# Altium schematic symbol library MCU_Microchip_ATmega.SchLib: 440 symbols (part 6 of 7) (continued)
## ATxmega64B1-A (continued)

## ATxmega64B1-C
designator *  value ATxmega64B1-C  Reference: U
ki_keywords: AVR 8/16bit Microcontroller XMegaAVR; ki_description: 32MHz, 64kB Flash, 4kB Boot, 4kB SRAM, 2kB EEPROM, JTAG, USB, LCD, VFBGA-100; ki_fp_filters: VFBGA*7.0x7.0mm*Layout10x10*P0.65mm*; Footprint: Package_BGA:VFBGA-100_7.0x7.0mm_Layout10x10_P0.65mm; Datasheet: http://ww1.microchip.com/downloads/en/DeviceDoc/Atmel-8330-8-and-16-bit-AVR-Microcontroller-XMEGA-B-ATxmega64B1-ATxmega128B1_Datasheet.pdf
pins: A1 PC0, A2 VCC, A3 PB6, A4 PB2, A5 AVCC, A6 PA5, A7 PA1, A8 PR1/XTAL1, A9 COM2, A10 CAPH, B1 PC3, B2 GND, B3 PB7, B4 PB4, B5 AGND, B6 PA4, B7 PA0/AREF, B8 PR0/XTAL2, B9 COM1, B10 CAPL, C1 PC5, C2 PC4, C3 PC1, C4 PB5, C5 PA7, C6 PA3, C7 COM3, C8 COM0, C9 BIAS2, C10 BIAS1, D1 VCC hidden, D2 GND hidden, D3 PD0, D4 PC2, D5 PB0, D6 PA6, D7 SEG0, D8 VLCD, D9 GND hidden, D10 VCC hidden, E1 PD2, E2 ~{{RESET}/PDI_CLK}, E3 PD1, E4 PC6, E5 PB1, E6 PA2, E7 SEG1, E8 SEG4, E9 SEG3, E10 SEG2, F1 VCC hidden, F2 GND hidden, F3 PDI_DATA, F4 PC7, F5 PB3, F6 PM2/SEG29, F7 SEG10, F8 SEG7, F9 SEG6, F10 SEG5, G1 PE2, G2 PE1, G3 PE3, G4 PE0, G5 PE4, G6 SEG23, G7 SEG15, G8 SEG13, G9 SEG9, G10 SEG8, H1 PE5, H2 PE6, H3 PG1/SEG38, H4 PG4/SEG35, H5 PG7/SEG32, H6 PM5/SEG26, H7 SEG21, H8 SEG18, H9 SEG12, H10 SEG11, J1 PE7, J2 PG0/SEG39, J3 PG3/SEG36, J4 PG6/SEG33, J5 PM1/SEG30, J6 PM4/SEG27, J7 PM7/SEG24, J8 SEG20, J9 SEG16, J10 SEG14, K1 GND hidden, K2 VCC hidden, K3 PG2/SEG37, K4 PG5/SEG34, K5 PM0/SEG31, K6 PM3/SEG28, K7 PM6/SEG25, K8 SEG22, K9 SEG19, K10 SEG17

## ATxmega64B3-A
designator *  value ATxmega64B3-A  Reference: U
ki_keywords: AVR 8/16bit Microcontroller XMegaAVR; ki_description: 32MHz, 64kB Flash, 4kB Boot, 4kB SRAM, 2kB EEPROM, JTAG, USB, LCD, TQFP-64; ki_fp_filters: TQFP*14x14mm*P0.8mm*; Footprint: Package_QFP:TQFP-64_14x14mm_P0.8mm; Datasheet: http://ww1.microchip.com/downloads/en/DeviceDoc/Atmel-8074-8-and-16-bit-AVR-Microcontroller-XMEGA-B-ATxmega64B3-ATxmega128B3_Datasheet.pdf
pins: 1 PC0, 2 PC1, 3 PC2, 4 PC3, 5 PC4, 6 PC5, 7 PC6, 8 PC7, 9 GND, 10 VCC, 11 PD0, 12 PD1, 13 ~{{RESET}/PDI_CLK}, 14 PDI_DATA, 15 GND hidden, 16 VCC hidden, 17 PG0/SEG24, 18 PG1/SEG23, 19 PG2/SEG22, 20 PG3/SEG21, 21 PG4/SEG20, 22 PG5/SEG19, 23 PG6/SEG18, 24 PG7/SEG17, 25 PM0/SEG16, 26 PM1/SEG15, 27 PM2/SEG14, 28 PM3/SEG13, 29 PM4/SEG12, 30 PM5/SEG11, 31 PM6/SEG10, 32 PM7/SEG9, 33 SEG8, 34 SEG7, 35 SEG6, 36 SEG5, 37 SEG4, 38 SEG3, 39 SEG2, 40 SEG1, 41 SEG0, 42 GND hidden, 43 VCC hidden, 44 BIAS1, 45 BIAS2, 46 VLCD, 47 CAPL, 48 CAPH, 49 COM0, 50 COM1, 51 COM2, 52 COM3, 53 PR0/XTAL2, 54 PR1/XTAL1, 55 AGND, 56 AVCC, 57 PB0/AREF, 58 PB1, 59 PB2, 60 PB3, 61 PB4, 62 PB5, 63 PB6, 64 PB7

## ATxmega64B3-M
designator *  value ATxmega64B3-M  Reference: U
ki_keywords: AVR 8/16bit Microcontroller XMegaAVR; ki_description: 32MHz, 64kB Flash, 4kB Boot, 4kB SRAM, 2kB EEPROM, JTAG, USB, LCD, QFN-64; ki_fp_filters: QFN*1EP*9x9mm*P0.5mm*; Footprint: Package_DFN_QFN:QFN-64-1EP_9x9mm_P0.5mm_EP7.65x7.65mm; Datasheet: http://ww1.microchip.com/downloads/en/DeviceDoc/Atmel-8074-8-and-16-bit-AVR-Microcontroller-XMEGA-B-ATxmega64B3-ATxmega128B3_Datasheet.pdf
pins: 1 PC0, 2 PC1, 3 PC2, 4 PC3, 5 PC4, 6 PC5, 7 PC6, 8 PC7, 9 GND, 10 VCC, 11 PD0, 12 PD1, 13 ~{{RESET}/PDI_CLK}, 14 PDI_DATA, 15 GND hidden, 16 VCC hidden, 17 PG0/SEG24, 18 PG1/SEG23, 19 PG2/SEG22, 20 PG3/SEG21, 21 PG4/SEG20, 22 PG5/SEG19, 23 PG6/SEG18, 24 PG7/SEG17, 25 PM0/SEG16, 26 PM1/SEG15, 27 PM2/SEG14, 28 PM3/SEG13, 29 PM4/SEG12, 30 PM5/SEG11, 31 PM6/SEG10, 32 PM7/SEG9, 33 SEG8, 34 SEG7, 35 SEG6, 36 SEG5, 37 SEG4, 38 SEG3, 39 SEG2, 40 SEG1, 41 SEG0, 42 GND hidden, 43 VCC hidden, 44 BIAS1, 45 BIAS2, 46 VLCD, 47 CAPL, 48 CAPH, 49 COM0, 50 COM1, 51 COM2, 52 COM3, 53 PR0/XTAL2, 54 PR1/XTAL1, 55 AGND, 56 AVCC, 57 PB0/AREF, 58 PB1, 59 PB2, 60 PB3, 61 PB4, 62 PB5, 63 PB6, 64 PB7, 65 GND hidden

## ATxmega64C3-A
designator *  value ATxmega64C3-A  Reference: U
ki_keywords: AVR 8/16bit Microcontroller XMegaAVR; ki_description: 32MHz, 64kB Flash, 4kB Boot, 4kB SRAM, 2kB EEPROM, JTAG, USB, TQFP-64; ki_fp_filters: TQFP*14x14mm*P0.8mm*; Footprint: Package_QFP:TQFP-64_14x14mm_P0.8mm; Datasheet: http://ww1.microchip.com/downloads/en/DeviceDoc/Atmel-8492-8-and-16-bit-AVR-microcontroller-ATxmega32C3_64C3_128C3_192C3_256C3_datasheet.pdf
pins: 1 PA3, 2 PA4, 3 PA5, 4 PA6, 5 PA7, 6 AREFB/PB0, 7 PB1, 8 PB2, 9 PB3, 10 PB4, 11 PB5, 12 PB6, 13 PB7, 14 GND, 15 VCC, 16 PC0, 17 PC1, 18 PC2, 19 PC3, 20 PC4, 21 PC5, 22 PC6, 23 PC7, 24 GND hidden, 25 VCC hidden, 26 PD0, 27 PD1, 28 PD2, 29 PD3, 30 PD4, 31 PD5, 32 PD6, 33 PD7, 34 GND hidden, 35 VCC hidden, 36 PE0, 37 PE1, 38 PE2, 39 PE3, 40 PE4, 41 PE5, 42 PE6, 43 PE7, 44 GND hidden, 45 VCC hidden, 46 PF0, 47 PF1, 48 PF2, 49 PF3, 50 PF4, 51 PF5, 52 GND hidden, 53 VCC hidden, 54 PF6, 55 PF7, 56 PDI_DATA, 57 ~{{RESET}/PDI_CLK}, 58 PR0/XTAL2, 59 PR1/XTAL1, 60 GND hidden, 61 AVCC, 62 AREFA/PA0, 63 PA1, 64 PA2

## ATxmega64C3-M
designator *  value ATxmega64C3-M  Reference: U
ki_keywords: AVR 8/16bit Microcontroller XMegaAVR; ki_description: 32MHz, 64kB Flash, 4kB Boot, 4kB SRAM, 2kB EEPROM, JTAG, USB, QFN-64; ki_fp_filters: QFN*1EP*9x9mm*P0.5mm*; Footprint: Package_DFN_QFN:QFN-64-1EP_9x9mm_P0.5mm_EP7.65x7.65mm; Datasheet: http://ww1.microchip.com/downloads/en/DeviceDoc/Atmel-8492-8-and-16-bit-AVR-microcontroller-ATxmega32C3_64C3_128C3_192C3_256C3_datasheet.pdf
pins: 1 PA3, 2 PA4, 3 PA5, 4 PA6, 5 PA7, 6 AREFB/PB0, 7 PB1, 8 PB2, 9 PB3, 10 PB4, 11 PB5, 12 PB6, 13 PB7, 14 GND, 15 VCC, 16 PC0, 17 PC1, 18 PC2, 19 PC3, 20 PC4, 21 PC5, 22 PC6, 23 PC7, 24 GND hidden, 25 VCC hidden, 26 PD0, 27 PD1, 28 PD2, 29 PD3, 30 PD4, 31 PD5, 32 PD6, 33 PD7, 34 GND hidden, 35 VCC hidden, 36 PE0, 37 PE1, 38 PE2, 39 PE3, 40 PE4, 41 PE5, 42 PE6, 43 PE7, 44 GND hidden, 45 VCC hidden, 46 PF0, 47 PF1, 48 PF2, 49 PF3, 50 PF4, 51 PF5, 52 GND hidden, 53 VCC hidden, 54 PF6, 55 PF7, 56 PDI_DATA, 57 ~{{RESET}/PDI_CLK}, 58 PR0/XTAL2, 59 PR1/XTAL1, 60 GND hidden, 61 AVCC, 62 AREFA/PA0, 63 PA1, 64 PA2, 65 GND hidden

## ATxmega64D3-A
designator *  value ATxmega64D3-A  Reference: U
ki_keywords: AVR 8/16bit Microcontroller XMegaAVR; ki_description: 32MHz, 64kB Flash, 4kB Boot, 4kB SRAM, 2kB EEPROM, JTAG, TQFP-64; ki_fp_filters: TQFP*14x14mm*P0.8mm*; Footprint: Package_QFP:TQFP-64_14x14mm_P0.8mm; Datasheet: http://ww1.microchip.com/downloads/en/DeviceDoc/Atmel-8134-8-16-bit-Atmel-XMEGA-D3-Microcontroller_Datasheet.pdf
pins: 1 PA3, 2 PA4, 3 PA5, 4 PA6, 5 PA7, 6 AREFB/PB0, 7 PB1, 8 PB2, 9 PB3, 10 PB4, 11 PB5, 12 PB6, 13 PB7, 14 GND, 15 VCC, 16 PC0, 17 PC1, 18 PC2, 19 PC3, 20 PC4, 21 PC5, 22 PC6, 23 PC7, 24 GND hidden, 25 VCC hidden, 26 PD0, 27 PD1, 28 PD2, 29 PD3, 30 PD4, 31 PD5, 32 PD6, 33 PD7, 34 GND hidden, 35 VCC hidden, 36 PE0, 37 PE1, 38 PE2, 39 PE3, 40 PE4, 41 PE5, 42 PE6, 43 PE7, 44 GND hidden, 45 VCC hidden, 46 PF0, 47 PF1, 48 PF2, 49 PF3, 50 PF4, 51 PF5, 52 GND hidden, 53 VCC hidden, 54 PF6, 55 PF7, 56 PDI_DATA, 57 ~{{RESET}/PDI_CLK}, 58 PR0/XTAL2, 59 PR1/XTAL1, 60 GND hidden, 61 AVCC, 62 AREFA/PA0, 63 PA1, 64 PA2

## ATxmega64D3-M
designator *  value ATxmega64D3-M  Reference: U
ki_keywords: AVR 8/16bit Microcontroller XMegaAVR; ki_description: 32MHz, 64kB Flash, 4kB Boot, 4kB SRAM, 2kB EEPROM, JTAG, QFN-64; ki_fp_filters: QFN*1EP*9x9mm*P0.5mm*; Footprint: Package_DFN_QFN:QFN-64-1EP_9x9mm_P0.5mm_EP7.65x7.65mm; Datasheet: http://ww1.microchip.com/downloads/en/DeviceDoc/Atmel-8134-8-16-bit-Atmel-XMEGA-D3-Microcontroller_Datasheet.pdf
pins: 1 PA3, 2 PA4, 3 PA5, 4 PA6, 5 PA7, 6 AREFB/PB0, 7 PB1, 8 PB2, 9 PB3, 10 PB4, 11 PB5, 12 PB6, 13 PB7, 14 GND, 15 VCC, 16 PC0, 17 PC1, 18 PC2, 19 PC3, 20 PC4, 21 PC5, 22 PC6, 23 PC7, 24 GND hidden, 25 VCC hidden, 26 PD0, 27 PD1, 28 PD2, 29 PD3, 30 PD4, 31 PD5, 32 PD6, 33 PD7, 34 GND hidden, 35 VCC hidden, 36 PE0, 37 PE1, 38 PE2, 39 PE3, 40 PE4, 41 PE5, 42 PE6, 43 PE7, 44 GND hidden, 45 VCC hidden, 46 PF0, 47 PF1, 48 PF2, 49 PF3, 50 PF4, 51 PF5, 52 GND hidden, 53 VCC hidden, 54 PF6, 55 PF7, 56 PDI_DATA, 57 ~{{RESET}/PDI_CLK}, 58 PR0/XTAL2, 59 PR1/XTAL1, 60 GND hidden, 61 AVCC, 62 AREFA/PA0, 63 PA1, 64 PA2, 65 GND hidden

## ATxmega64D4-A
designator *  value ATxmega64D4-A  Reference: U
ki_keywords: AVR 8/16bit Microcontroller XMegaAVR; ki_description: 32MHz, 64kB Flash, 4kB Boot, 4kB SRAM, 2kB EEPROM, JTAG, TQFP-44; ki_fp_filters: TQFP*10x10mm*P0.8mm*; Footprint: Package_QFP:TQFP-44_10x10mm_P0.8mm; Datasheet: http://ww1.microchip.com/downloads/en/DeviceDoc/Atmel-8135-8-and-16-bit-AVR-microcontroller-ATxmega16D4-32D4-64D4-128D4_datasheet.pdf
pins: 1 PA5, 2 PA6, 3 PA7, 4 AREF/PB0, 5 PB1, 6 PB2, 7 PB3, 8 GND, 9 VCC, 10 PC0, 11 PC1, 12 PC2, 13 PC3, 14 PC4, 15 PC5, 16 PC6, 17 PC7, 18 GND hidden, 19 VCC hidden, 20 PD0, 21 PD1, 22 PD2, 23 PD3, 24 PD4, 25 PD5, 26 PD6, 27 PD7, 28 PE0, 29 PE1, 30 GND hidden, 31 VCC hidden, 32 PE2, 33 PE3, 34 PDI_DATA, 35 ~{{RESET}/PDI_CLK}, 36 PR0/XTAL2, 37 PR1/XTAL1, 38 GND hidden, 39 AVCC, 40 AREF/PA0, 41 PA1, 42 PA2, 43 PA3, 44 PA4

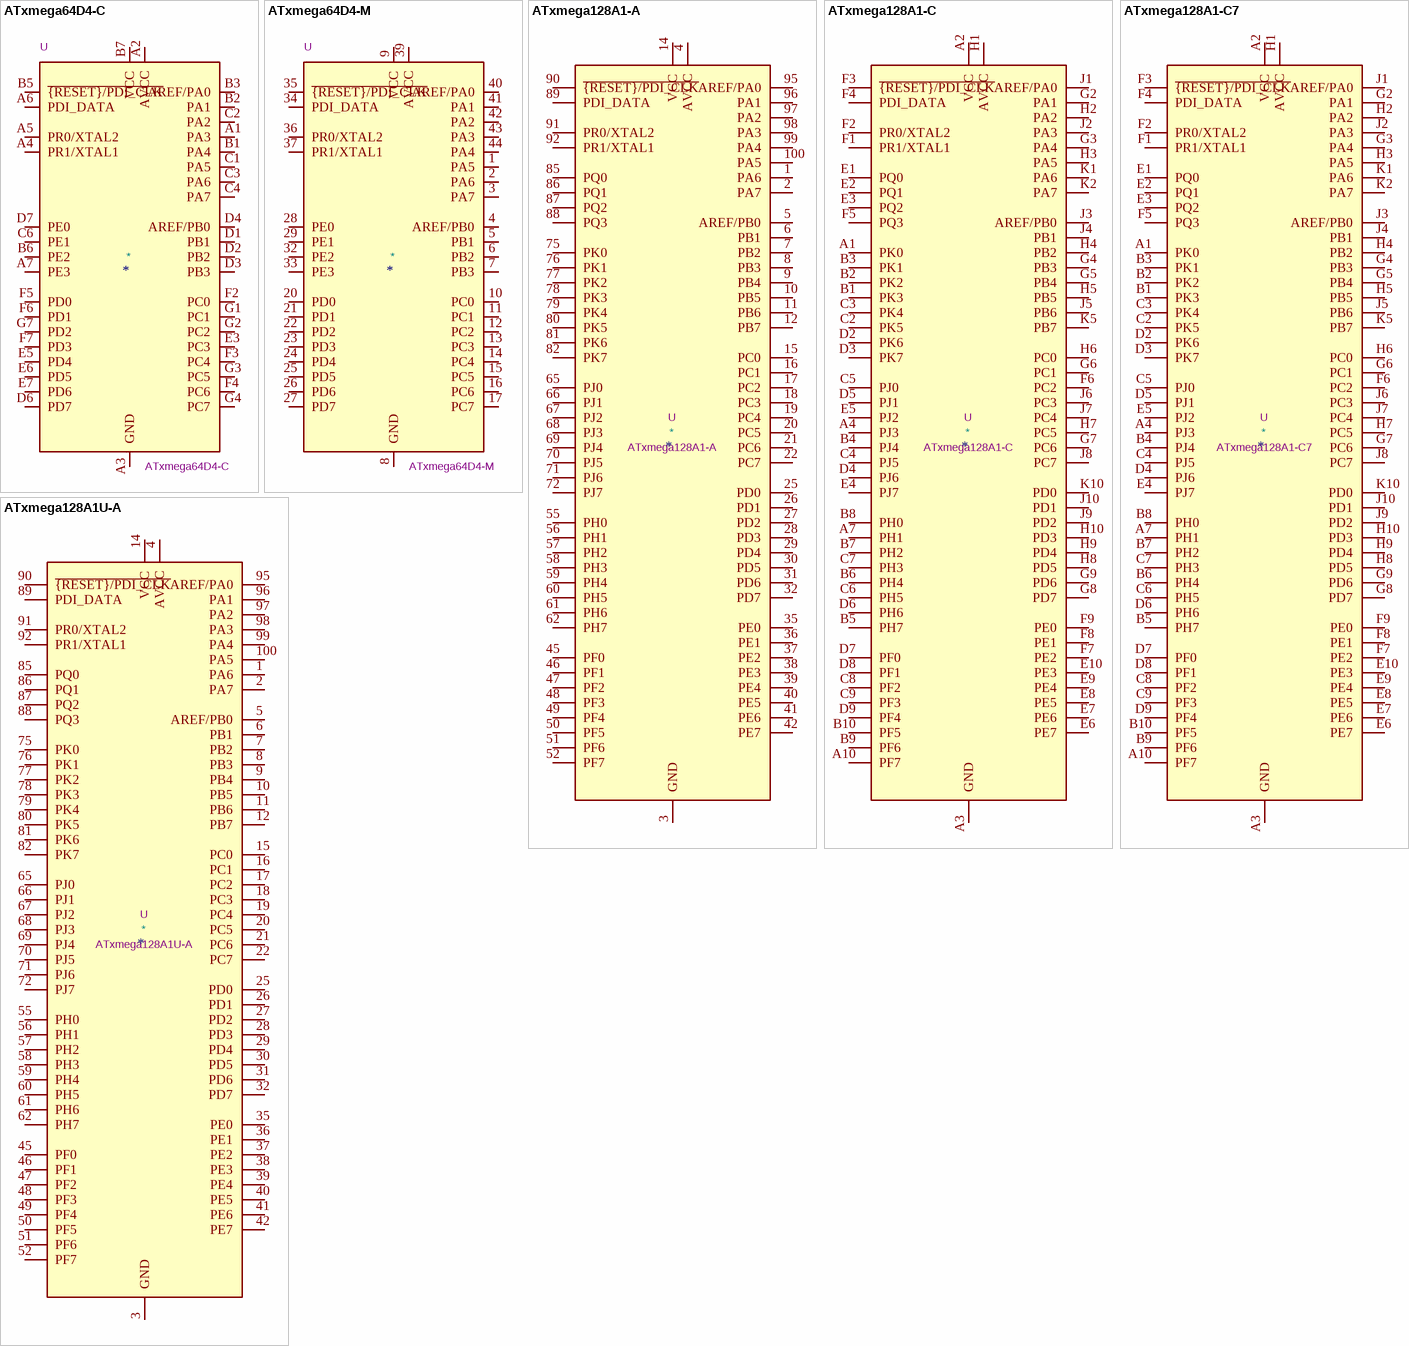
[diagram p35: symbols ATxmega64D4-C to ATxmega128A1U-A]

## ATxmega64D4-C
designator *  value ATxmega64D4-C  Reference: U
ki_keywords: AVR 8/16bit Microcontroller XMegaAVR; ki_description: 32MHz, 64kB Flash, 4kB Boot, 4kB SRAM, 2kB EEPROM, JTAG, VFBGA-49; ki_fp_filters: VFBGA*5.0x5.0mm*Layout7x7*P0.65mm*; Footprint: Package_BGA:VFBGA-49_5.0x5.0mm_Layout7x7_P0.65mm; Datasheet: http://ww1.microchip.com/downloads/en/DeviceDoc/Atmel-8135-8-and-16-bit-AVR-microcontroller-ATxmega16D4-32D4-64D4-128D4_datasheet.pdf
pins: A1 PA3, A2 AVCC, A3 GND, A4 PR1/XTAL1, A5 PR0/XTAL2, A6 PDI_DATA, A7 PE3, B1 PA4, B2 PA1, B3 AREF/PA0, B4 GND hidden, B5 ~{{RESET}/PDI_CLK}, B6 PE2, B7 VCC, C1 PA5, C2 PA2, C3 PA6, C4 PA7, C5 GND hidden, C6 PE1, C7 GND hidden, D1 PB1, D2 PB2, D3 PB3, D4 AREF/PB0, D5 GND hidden, D6 PD7, D7 PE0, E1 GND hidden, E2 GND hidden, E3 PC3, E4 GND hidden, E5 PD4, E6 PD5, E7 PD6, F1 VCC hidden, F2 PC0, F3 PC4, F4 PC6, F5 PD0, F6 PD1, F7 PD3, G1 PC1, G2 PC2, G3 PC5, G4 PC7, G5 GND hidden, G6 VCC hidden, G7 PD2

## ATxmega64D4-M
designator *  value ATxmega64D4-M  Reference: U
ki_keywords: AVR 8/16bit Microcontroller XMegaAVR; ki_description: 32MHz, 64kB Flash, 4kB Boot, 4kB SRAM, 2kB EEPROM, JTAG, QFN-44; ki_fp_filters: QFN*1EP*7x7mm*P0.5mm*; Footprint: Package_DFN_QFN:QFN-44-1EP_7x7mm_P0.5mm_EP5.2x5.2mm; Datasheet: http://ww1.microchip.com/downloads/en/DeviceDoc/Atmel-8135-8-and-16-bit-AVR-microcontroller-ATxmega16D4-32D4-64D4-128D4_datasheet.pdf
pins: 1 PA5, 2 PA6, 3 PA7, 4 AREF/PB0, 5 PB1, 6 PB2, 7 PB3, 8 GND, 9 VCC, 10 PC0, 11 PC1, 12 PC2, 13 PC3, 14 PC4, 15 PC5, 16 PC6, 17 PC7, 18 GND hidden, 19 VCC hidden, 20 PD0, 21 PD1, 22 PD2, 23 PD3, 24 PD4, 25 PD5, 26 PD6, 27 PD7, 28 PE0, 29 PE1, 30 GND hidden, 31 VCC hidden, 32 PE2, 33 PE3, 34 PDI_DATA, 35 ~{{RESET}/PDI_CLK}, 36 PR0/XTAL2, 37 PR1/XTAL1, 38 GND hidden, 39 AVCC, 40 AREF/PA0, 41 PA1, 42 PA2, 43 PA3, 44 PA4, 45 GND hidden

## ATxmega128A1-A
designator *  value ATxmega128A1-A  Reference: U
ki_keywords: AVR 8/16bit Microcontroller XMegaAVR; ki_description: 32MHz, 128kB Flash, 8kB Boot, 8kB SRAM, 2kB EEPROM, JTAG, TQFP-100; ki_fp_filters: TQFP*14x14mm*P0.5mm*; Footprint: Package_QFP:TQFP-100_14x14mm_P0.5mm; Datasheet: http://ww1.microchip.com/downloads/en/DeviceDoc/Atmel-8067-8-and-16-bit-AVR-Microcontrollers-ATxmega64A1-ATxmega128A1_Datasheet.pdf
pins: 1 PA6, 2 PA7, 3 GND, 4 AVCC, 5 AREF/PB0, 6 PB1, 7 PB2, 8 PB3, 9 PB4, 10 PB5, 11 PB6, 12 PB7, 13 GND hidden, 14 VCC, 15 PC0, 16 PC1, 17 PC2, 18 PC3, 19 PC4, 20 PC5, 21 PC6, 22 PC7, 23 GND hidden, 24 VCC hidden, 25 PD0, 26 PD1, 27 PD2, 28 PD3, 29 PD4, 30 PD5, 31 PD6, 32 PD7, 33 GND hidden, 34 VCC hidden, 35 PE0, 36 PE1, 37 PE2, 38 PE3, 39 PE4, 40 PE5, 41 PE6, 42 PE7, 43 GND hidden, 44 VCC hidden, 45 PF0, 46 PF1, 47 PF2, 48 PF3, 49 PF4, 50 PF5, 51 PF6, 52 PF7, 53 GND hidden, 54 VCC hidden, 55 PH0, 56 PH1, 57 PH2, 58 PH3, 59 PH4, 60 PH5, 61 PH6, 62 PH7, 63 GND hidden, 64 VCC hidden, 65 PJ0, 66 PJ1, 67 PJ2, 68 PJ3, 69 PJ4, 70 PJ5, 71 PJ6, 72 PJ7, 73 GND hidden, 74 VCC hidden, 75 PK0, 76 PK1, 77 PK2, 78 PK3, 79 PK4, 80 PK5, 81 PK6, 82 PK7, 83 VCC hidden, 84 GND hidden, 85 PQ0, 86 PQ1, 87 PQ2, 88 PQ3, 89 PDI_DATA, 90 ~{{RESET}/PDI_CLK}, 91 PR0/XTAL2, 92 PR1/XTAL1, 93 GND hidden, 94 AVCC hidden, 95 AREF/PA0, 96 PA1, 97 PA2, 98 PA3, 99 PA4, 100 PA5

## ATxmega128A1-C
designator *  value ATxmega128A1-C  Reference: U
ki_keywords: AVR 8/16bit Microcontroller XMegaAVR; ki_description: 32MHz, 128kB Flash, 8kB Boot, 8kB SRAM, 2kB EEPROM, JTAG, TFBGA-100; ki_fp_filters: TFBGA*9.0x9.0mm*Layout10x10*P0.8mm*; Footprint: Package_BGA:TFBGA-100_9.0x9.0mm_Layout10x10_P0.8mm; Datasheet: http://ww1.microchip.com/downloads/en/DeviceDoc/Atmel-8067-8-and-16-bit-AVR-Microcontrollers-ATxmega64A1-ATxmega128A1_Datasheet.pdf
pins: A1 PK0, A2 VCC, A3 GND, A4 PJ3, A5 VCC hidden, A6 GND hidden, A7 PH1, A8 GND hidden, A9 VCC hidden, A10 PF7, B1 PK3, B2 PK2, B3 PK1, B4 PJ4, B5 PH7, B6 PH4, B7 PH2, B8 PH0, B9 PF6, B10 PF5, C1 VCC hidden, C2 PK5, C3 PK4, C4 PJ5, C5 PJ0, C6 PH5, C7 PH3, C8 PF2, C9 PF3, C10 VCC hidden, D1 GND hidden, D2 PK6, D3 PK7, D4 PJ6, D5 PJ1, D6 PH6, D7 PF0, D8 PF1, D9 PF4, D10 GND hidden, E1 PQ0, E2 PQ1, E3 PQ2, E4 PJ7, E5 PJ2, E6 PE7, E7 PE6, E8 PE5, E9 PE4, E10 PE3, F1 PR1/XTAL1, F2 PR0/XTAL2, F3 ~{{RESET}/PDI_CLK}, F4 PDI_DATA, F5 PQ3, F6 PC2, F7 PE2, F8 PE1, F9 PE0, F10 VCC hidden, G1 GND hidden, G2 PA1, G3 PA4, G4 PB3, G5 PB4, G6 PC1, G7 PC6, G8 PD7, G9 PD6, G10 GND hidden, H1 AVCC, H2 PA2, H3 PA5, H4 PB2, H5 PB5, H6 PC0, H7 PC5, H8 PD5, H9 PD4, H10 PD3, J1 AREF/PA0, J2 PA3, J3 AREF/PB0, J4 PB1, J5 PB6, J6 PC3, J7 PC4, J8 PC7, J9 PD2, J10 PD1, K1 PA6, K2 PA7, K3 GND hidden, K4 AVCC hidden, K5 PB7, K6 VCC hidden, K7 GND hidden, K8 VCC hidden, K9 GND hidden, K10 PD0

## ATxmega128A1-C7
designator *  value ATxmega128A1-C7  Reference: U
ki_keywords: AVR 8/16bit Microcontroller XMegaAVR; ki_description: 32MHz, 128kB Flash, 8kB Boot, 8kB SRAM, 2kB EEPROM, JTAG, VFBGA-100; ki_fp_filters: VFBGA*7.0x7.0mm*Layout10x10*P0.65mm*; Footprint: Package_BGA:VFBGA-100_7.0x7.0mm_Layout10x10_P0.65mm; Datasheet: http://ww1.microchip.com/downloads/en/DeviceDoc/Atmel-8067-8-and-16-bit-AVR-Microcontrollers-ATxmega64A1-ATxmega128A1_Datasheet.pdf
pins: A1 PK0, A2 VCC, A3 GND, A4 PJ3, A5 VCC hidden, A6 GND hidden, A7 PH1, A8 GND hidden, A9 VCC hidden, A10 PF7, B1 PK3, B2 PK2, B3 PK1, B4 PJ4, B5 PH7, B6 PH4, B7 PH2, B8 PH0, B9 PF6, B10 PF5, C1 VCC hidden, C2 PK5, C3 PK4, C4 PJ5, C5 PJ0, C6 PH5, C7 PH3, C8 PF2, C9 PF3, C10 VCC hidden, D1 GND hidden, D2 PK6, D3 PK7, D4 PJ6, D5 PJ1, D6 PH6, D7 PF0, D8 PF1, D9 PF4, D10 GND hidden, E1 PQ0, E2 PQ1, E3 PQ2, E4 PJ7, E5 PJ2, E6 PE7, E7 PE6, E8 PE5, E9 PE4, E10 PE3, F1 PR1/XTAL1, F2 PR0/XTAL2, F3 ~{{RESET}/PDI_CLK}, F4 PDI_DATA, F5 PQ3, F6 PC2, F7 PE2, F8 PE1, F9 PE0, F10 VCC hidden, G1 GND hidden, G2 PA1, G3 PA4, G4 PB3, G5 PB4, G6 PC1, G7 PC6, G8 PD7, G9 PD6, G10 GND hidden, H1 AVCC, H2 PA2, H3 PA5, H4 PB2, H5 PB5, H6 PC0, H7 PC5, H8 PD5, H9 PD4, H10 PD3, J1 AREF/PA0, J2 PA3, J3 AREF/PB0, J4 PB1, J5 PB6, J6 PC3, J7 PC4, J8 PC7, J9 PD2, J10 PD1, K1 PA6, K2 PA7, K3 GND hidden, K4 AVCC hidden, K5 PB7, K6 VCC hidden, K7 GND hidden, K8 VCC hidden, K9 GND hidden, K10 PD0

## ATxmega128A1U-A
designator *  value ATxmega128A1U-A  Reference: U
ki_keywords: AVR 8/16bit Microcontroller XMegaAVR; ki_description: 32MHz, 128kB Flash, 8kB Boot, 8kB SRAM, 2kB EEPROM, JTAG, USB, TQFP-100; ki_fp_filters: TQFP*14x14mm*P0.5mm*; Footprint: Package_QFP:TQFP-100_14x14mm_P0.5mm; Datasheet: http://ww1.microchip.com/downloads/en/DeviceDoc/Atmel-8385-8-and-16-bit-AVR-Microcontroller-ATxmega64A1U-ATxmega128A1U_datasheet.pdf
pins: 1 PA6, 2 PA7, 3 GND, 4 AVCC, 5 AREF/PB0, 6 PB1, 7 PB2, 8 PB3, 9 PB4, 10 PB5, 11 PB6, 12 PB7, 13 GND hidden, 14 VCC, 15 PC0, 16 PC1, 17 PC2, 18 PC3, 19 PC4, 20 PC5, 21 PC6, 22 PC7, 23 GND hidden, 24 VCC hidden, 25 PD0, 26 PD1, 27 PD2, 28 PD3, 29 PD4, 30 PD5, 31 PD6, 32 PD7, 33 GND hidden, 34 VCC hidden, 35 PE0, 36 PE1, 37 PE2, 38 PE3, 39 PE4, 40 PE5, 41 PE6, 42 PE7, 43 GND hidden, 44 VCC hidden, 45 PF0, 46 PF1, 47 PF2, 48 PF3, 49 PF4, 50 PF5, 51 PF6, 52 PF7, 53 GND hidden, 54 VCC hidden, 55 PH0, 56 PH1, 57 PH2, 58 PH3, 59 PH4, 60 PH5, 61 PH6, 62 PH7, 63 GND hidden, 64 VCC hidden, 65 PJ0, 66 PJ1, 67 PJ2, 68 PJ3, 69 PJ4, 70 PJ5, 71 PJ6, 72 PJ7, 73 GND hidden, 74 VCC hidden, 75 PK0, 76 PK1, 77 PK2, 78 PK3, 79 PK4, 80 PK5, 81 PK6, 82 PK7, 83 VCC hidden, 84 GND hidden, 85 PQ0, 86 PQ1, 87 PQ2, 88 PQ3, 89 PDI_DATA, 90 ~{{RESET}/PDI_CLK}, 91 PR0/XTAL2, 92 PR1/XTAL1, 93 GND hidden, 94 AVCC hidden, 95 AREF/PA0, 96 PA1, 97 PA2, 98 PA3, 99 PA4, 100 PA5

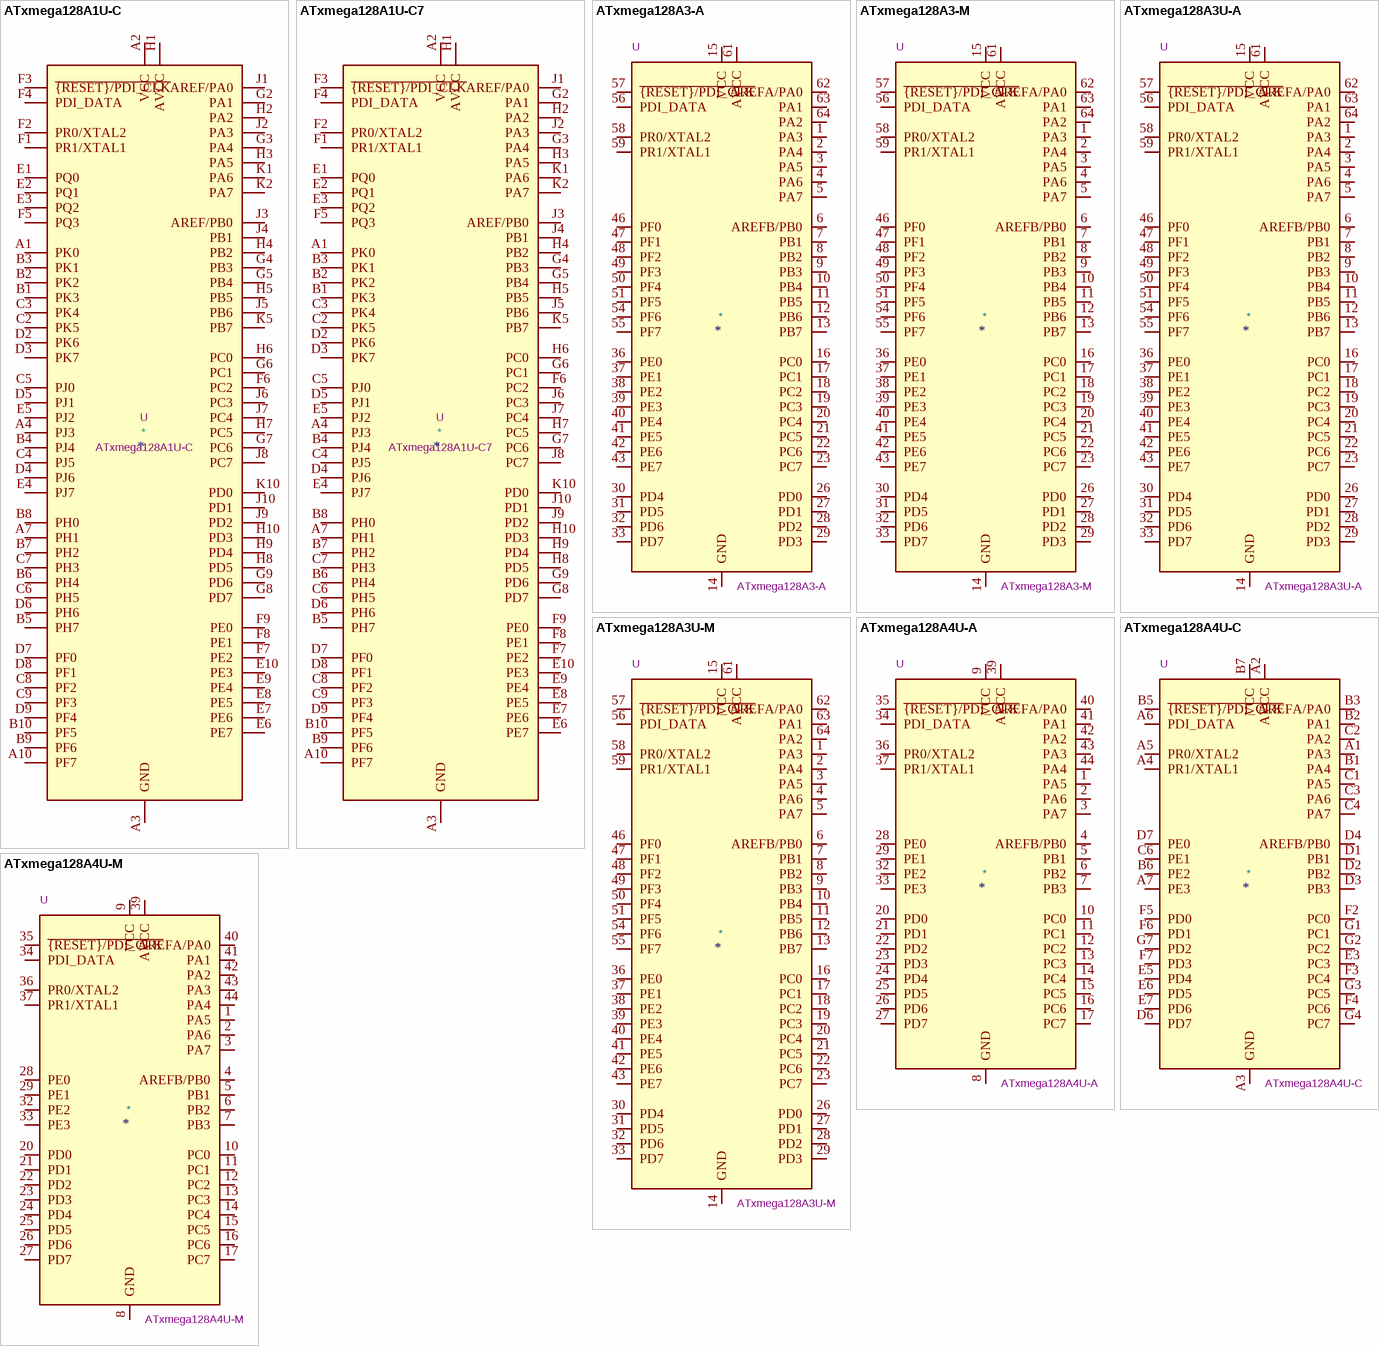
[diagram p36: symbols ATxmega128A1U-C to ATxmega128A4U-M]

## ATxmega128A1U-C
designator *  value ATxmega128A1U-C  Reference: U
ki_keywords: AVR 8/16bit Microcontroller XMegaAVR; ki_description: 32MHz, 128kB Flash, 8kB Boot, 8kB SRAM, 2kB EEPROM, JTAG, USB, TFBGA-100; ki_fp_filters: TFBGA*9.0x9.0mm*Layout10x10*P0.8mm*; Footprint: Package_BGA:TFBGA-100_9.0x9.0mm_Layout10x10_P0.8mm; Datasheet: http://ww1.microchip.com/downloads/en/DeviceDoc/Atmel-8385-8-and-16-bit-AVR-Microcontroller-ATxmega64A1U-ATxmega128A1U_datasheet.pdf
pins: A1 PK0, A2 VCC, A3 GND, A4 PJ3, A5 VCC hidden, A6 GND hidden, A7 PH1, A8 GND hidden, A9 VCC hidden, A10 PF7, B1 PK3, B2 PK2, B3 PK1, B4 PJ4, B5 PH7, B6 PH4, B7 PH2, B8 PH0, B9 PF6, B10 PF5, C1 VCC hidden, C2 PK5, C3 PK4, C4 PJ5, C5 PJ0, C6 PH5, C7 PH3, C8 PF2, C9 PF3, C10 VCC hidden, D1 GND hidden, D2 PK6, D3 PK7, D4 PJ6, D5 PJ1, D6 PH6, D7 PF0, D8 PF1, D9 PF4, D10 GND hidden, E1 PQ0, E2 PQ1, E3 PQ2, E4 PJ7, E5 PJ2, E6 PE7, E7 PE6, E8 PE5, E9 PE4, E10 PE3, F1 PR1/XTAL1, F2 PR0/XTAL2, F3 ~{{RESET}/PDI_CLK}, F4 PDI_DATA, F5 PQ3, F6 PC2, F7 PE2, F8 PE1, F9 PE0, F10 VCC hidden, G1 GND hidden, G2 PA1, G3 PA4, G4 PB3, G5 PB4, G6 PC1, G7 PC6, G8 PD7, G9 PD6, G10 GND hidden, H1 AVCC, H2 PA2, H3 PA5, H4 PB2, H5 PB5, H6 PC0, H7 PC5, H8 PD5, H9 PD4, H10 PD3, J1 AREF/PA0, J2 PA3, J3 AREF/PB0, J4 PB1, J5 PB6, J6 PC3, J7 PC4, J8 PC7, J9 PD2, J10 PD1, K1 PA6, K2 PA7, K3 GND hidden, K4 AVCC hidden, K5 PB7, K6 VCC hidden, K7 GND hidden, K8 VCC hidden, K9 GND hidden, K10 PD0

## ATxmega128A1U-C7
designator *  value ATxmega128A1U-C7  Reference: U
ki_keywords: AVR 8/16bit Microcontroller XMegaAVR; ki_description: 32MHz, 128kB Flash, 8kB Boot, 8kB SRAM, 2kB EEPROM, JTAG, USB, VFBGA-100; ki_fp_filters: VFBGA*7.0x7.0mm*Layout10x10*P0.65mm*; Footprint: Package_BGA:VFBGA-100_7.0x7.0mm_Layout10x10_P0.65mm; Datasheet: http://ww1.microchip.com/downloads/en/DeviceDoc/Atmel-8385-8-and-16-bit-AVR-Microcontroller-ATxmega64A1U-ATxmega128A1U_datasheet.pdf
pins: A1 PK0, A2 VCC, A3 GND, A4 PJ3, A5 VCC hidden, A6 GND hidden, A7 PH1, A8 GND hidden, A9 VCC hidden, A10 PF7, B1 PK3, B2 PK2, B3 PK1, B4 PJ4, B5 PH7, B6 PH4, B7 PH2, B8 PH0, B9 PF6, B10 PF5, C1 VCC hidden, C2 PK5, C3 PK4, C4 PJ5, C5 PJ0, C6 PH5, C7 PH3, C8 PF2, C9 PF3, C10 VCC hidden, D1 GND hidden, D2 PK6, D3 PK7, D4 PJ6, D5 PJ1, D6 PH6, D7 PF0, D8 PF1, D9 PF4, D10 GND hidden, E1 PQ0, E2 PQ1, E3 PQ2, E4 PJ7, E5 PJ2, E6 PE7, E7 PE6, E8 PE5, E9 PE4, E10 PE3, F1 PR1/XTAL1, F2 PR0/XTAL2, F3 ~{{RESET}/PDI_CLK}, F4 PDI_DATA, F5 PQ3, F6 PC2, F7 PE2, F8 PE1, F9 PE0, F10 VCC hidden, G1 GND hidden, G2 PA1, G3 PA4, G4 PB3, G5 PB4, G6 PC1, G7 PC6, G8 PD7, G9 PD6, G10 GND hidden, H1 AVCC, H2 PA2, H3 PA5, H4 PB2, H5 PB5, H6 PC0, H7 PC5, H8 PD5, H9 PD4, H10 PD3, J1 AREF/PA0, J2 PA3, J3 AREF/PB0, J4 PB1, J5 PB6, J6 PC3, J7 PC4, J8 PC7, J9 PD2, J10 PD1, K1 PA6, K2 PA7, K3 GND hidden, K4 AVCC hidden, K5 PB7, K6 VCC hidden, K7 GND hidden, K8 VCC hidden, K9 GND hidden, K10 PD0

## ATxmega128A3-A
designator *  value ATxmega128A3-A  Reference: U
ki_keywords: AVR 8/16bit Microcontroller XMegaAVR; ki_description: 32MHz, 128kB Flash, 8kB Boot, 8kB SRAM, 2kB EEPROM, JTAG, TQFP-64; ki_fp_filters: TQFP*14x14mm*P0.8mm*; Footprint: Package_QFP:TQFP-64_14x14mm_P0.8mm; Datasheet: http://ww1.microchip.com/downloads/en/DeviceDoc/Atmel-8068-8-and16-bit-AVR-XMEGA-A3-Microcontrollers_Datasheet.pdf
pins: 1 PA3, 2 PA4, 3 PA5, 4 PA6, 5 PA7, 6 AREFB/PB0, 7 PB1, 8 PB2, 9 PB3, 10 PB4, 11 PB5, 12 PB6, 13 PB7, 14 GND, 15 VCC, 16 PC0, 17 PC1, 18 PC2, 19 PC3, 20 PC4, 21 PC5, 22 PC6, 23 PC7, 24 GND hidden, 25 VCC hidden, 26 PD0, 27 PD1, 28 PD2, 29 PD3, 30 PD4, 31 PD5, 32 PD6, 33 PD7, 34 GND hidden, 35 VCC hidden, 36 PE0, 37 PE1, 38 PE2, 39 PE3, 40 PE4, 41 PE5, 42 PE6, 43 PE7, 44 GND hidden, 45 VCC hidden, 46 PF0, 47 PF1, 48 PF2, 49 PF3, 50 PF4, 51 PF5, 52 GND hidden, 53 VCC hidden, 54 PF6, 55 PF7, 56 PDI_DATA, 57 ~{{RESET}/PDI_CLK}, 58 PR0/XTAL2, 59 PR1/XTAL1, 60 GND hidden, 61 AVCC, 62 AREFA/PA0, 63 PA1, 64 PA2

## ATxmega128A3-M
designator *  value ATxmega128A3-M  Reference: U
ki_keywords: AVR 8/16bit Microcontroller XMegaAVR; ki_description: 32MHz, 128kB Flash, 8kB Boot, 8kB SRAM, 2kB EEPROM, JTAG, QFN-64; ki_fp_filters: QFN*1EP*9x9mm*P0.5mm*; Footprint: Package_DFN_QFN:QFN-64-1EP_9x9mm_P0.5mm_EP7.65x7.65mm; Datasheet: http://ww1.microchip.com/downloads/en/DeviceDoc/Atmel-8068-8-and16-bit-AVR-XMEGA-A3-Microcontrollers_Datasheet.pdf
pins: 1 PA3, 2 PA4, 3 PA5, 4 PA6, 5 PA7, 6 AREFB/PB0, 7 PB1, 8 PB2, 9 PB3, 10 PB4, 11 PB5, 12 PB6, 13 PB7, 14 GND, 15 VCC, 16 PC0, 17 PC1, 18 PC2, 19 PC3, 20 PC4, 21 PC5, 22 PC6, 23 PC7, 24 GND hidden, 25 VCC hidden, 26 PD0, 27 PD1, 28 PD2, 29 PD3, 30 PD4, 31 PD5, 32 PD6, 33 PD7, 34 GND hidden, 35 VCC hidden, 36 PE0, 37 PE1, 38 PE2, 39 PE3, 40 PE4, 41 PE5, 42 PE6, 43 PE7, 44 GND hidden, 45 VCC hidden, 46 PF0, 47 PF1, 48 PF2, 49 PF3, 50 PF4, 51 PF5, 52 GND hidden, 53 VCC hidden, 54 PF6, 55 PF7, 56 PDI_DATA, 57 ~{{RESET}/PDI_CLK}, 58 PR0/XTAL2, 59 PR1/XTAL1, 60 GND hidden, 61 AVCC, 62 AREFA/PA0, 63 PA1, 64 PA2, 65 GND hidden
